# Altium footprint library MyLibrarySum.PcbLib: 208 footprints (part 5 of 13)
Each footprint in its own frame and in the unit in brackets; x right, y up, seen from the top. Pads: shape width x height; smd on the part's side, far side on the other; paste and mask are expansions set on the pad; w line width, h text height; cw(c..) or ccw(c..) is an arc to the next point about the centre after c.
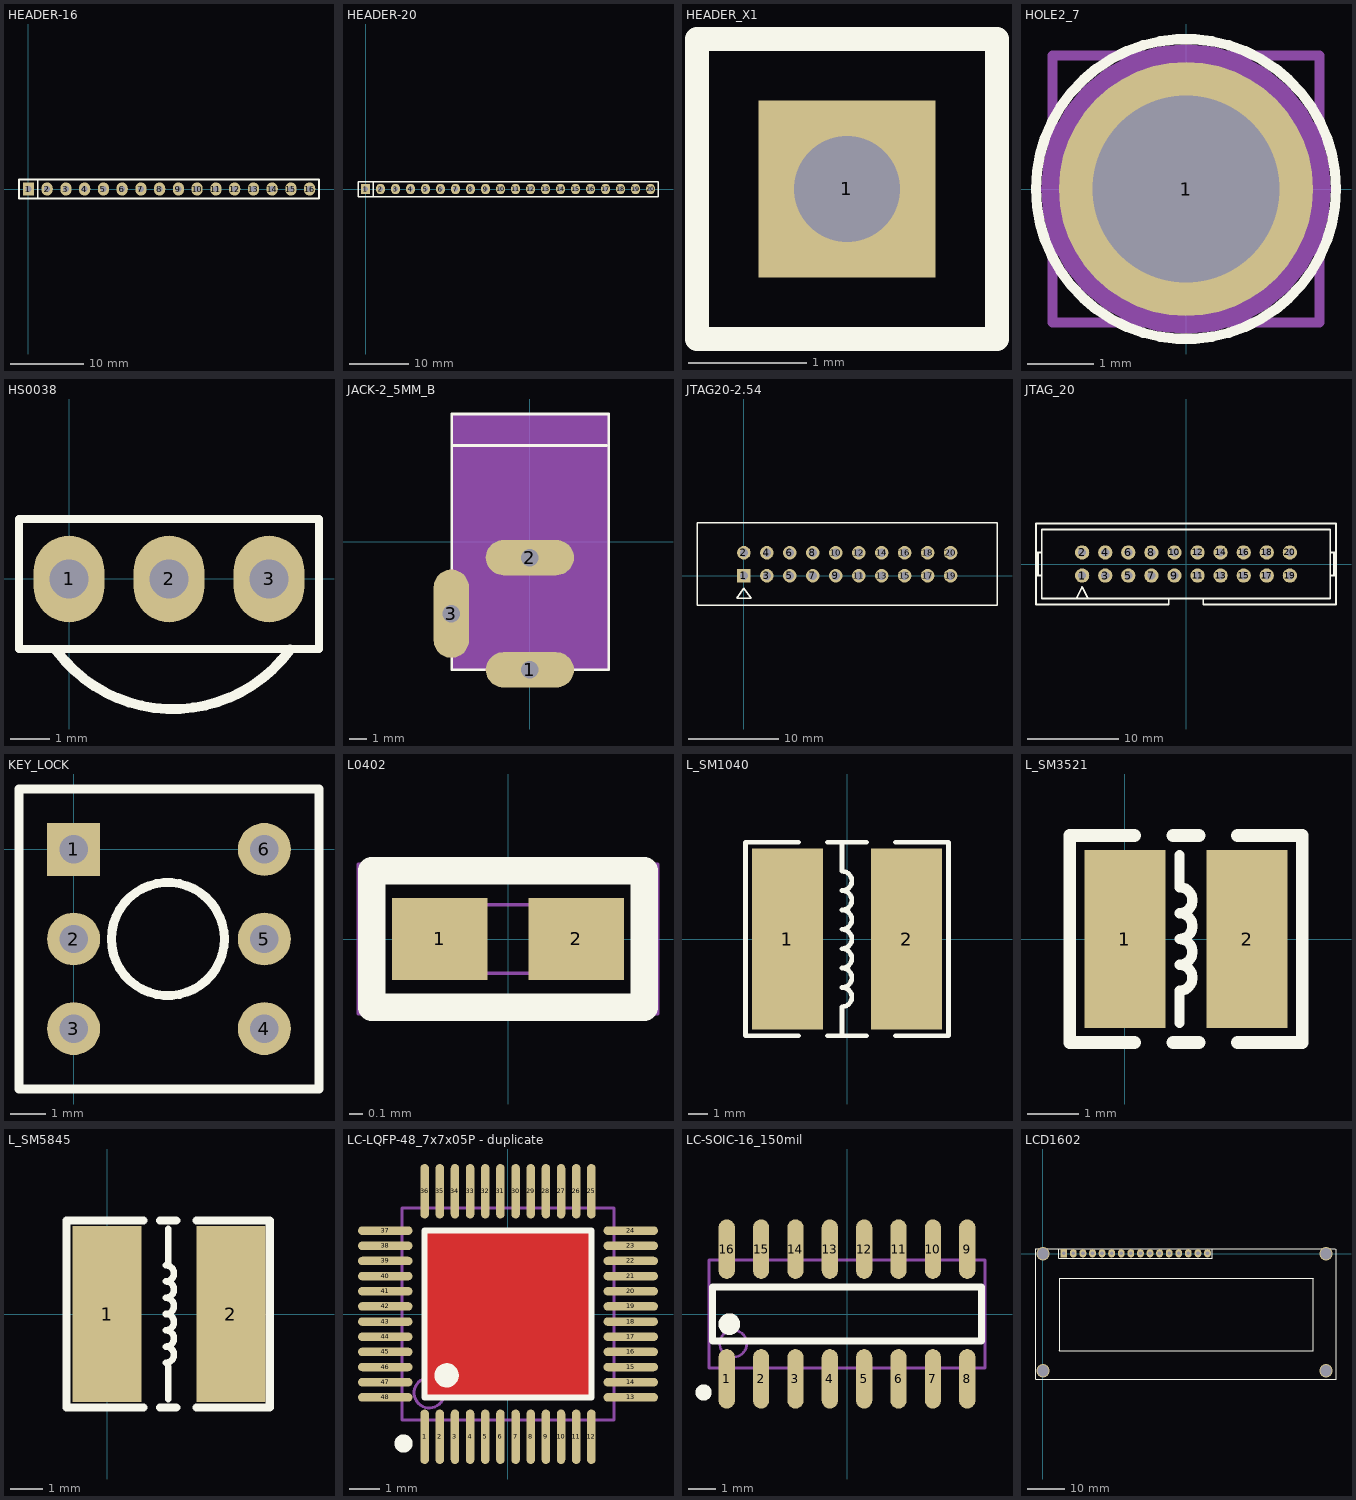
[diagram p4: the footprints below, top view; thin cyan lines are the x and y axes]

## HEADER-16 [mil]
pads (16):
  rect 60x70 hole 32: 1(0,0)
  oval 60x70 hole 32: 2(100,0) 3(200,0) 4(300,0) 5(400,0) 6(500,0) 7(600,0) 8(700,0) 9(800,0) 10(900,0) 11(1000,0) 12(1100,0) 13(1200,0) 14(1300,0) 15(1400,0) 16(1500,0)
Top Overlay:
  lines w10: 50,-50 50,50 ; -50,-50 -50,50 1550,50 1550,-50 -50,-50
3D body: height 397.64, standoff -59.06, extent -50,-50 1550,50

## HEADER-20 [mil]
pads (20):
  rect 60x70 hole 32: 1(0,0)
  oval 60x70 hole 32: 2(100,0) 3(200,0) 4(300,0) 5(400,0) 6(500,0) 7(600,0) 8(700,0) 9(800,0) 10(900,0) 11(1000,0) 12(1100,0) 13(1200,0) 14(1300,0) 15(1400,0) 16(1500,0) 17(1600,0) 18(1700,0) 19(1800,0) 20(1900,0)
Top Overlay:
  lines w10: 50,-50 50,50 ; -50,-50 1950,-50 1950,50 -50,50 -50,-50
3D body: height 397.64, standoff -59.06, extent -50,-40 1950,60

## HEADER_X1 [mm]
pads (1):
  rect 1.5x1.5 hole 0.9: 1(7.747,6.096)
Top Overlay:
  lines w0.2: 6.477,4.826 9.017,4.826 9.017,7.366 6.477,7.366 6.477,4.826

## HOLE2_7 [mil] "HOLE2_7"
pads (1):
  round 150 hole 110: 1(0,0)
Top Overlay:
  circle w5.98: c0,0 r88.46
Mechanical 11:
  text "1" at -8,0 h20
Mechanical 12:
  lines w5.98: -78.74,-78.74 78.74,-78.74 78.74,78.74 -78.74,78.74 -78.74,-78.74
Mechanical 13:
  pour cut-out: 85.41,0 83.77,16.66 78.91,32.69 71.02,47.45 60.39,60.39 47.45,71.02 32.69,78.91 16.66,83.77 0,85.41 -16.66,83.77 -32.69,78.91 -47.45,71.02 -60.39,60.39 -71.02,47.45 -78.91,32.69 -83.77,16.66 -85.41,0 -83.77,-16.66 -78.91,-32.69 -71.02,-47.45 -60.39,-60.39 -47.45,-71.02 -32.69,-78.91 -16.66,-83.77 0,-85.41 16.66,-83.77 32.69,-78.91 47.45,-71.02 60.39,-60.39 71.02,-47.45 78.91,-32.69 83.77,-16.66

## HS0038 [mm] "红外接收头"
pads (3):
  oval 1.8x2.2 hole 1: 1(0,0) 2(2.54,0) 3(5.08,0)
Top Overlay:
  lines w0.2: -1.27,-1.778 -1.27,1.524 6.35,1.524 6.35,-1.778 -1.27,-1.778
  lines w0.254: -0.315,-1.824 ccw(c2.639,0.381) 5.613,-1.797

## JACK-2_5MM_B [mm] "JACK-2_5MM_B"
pads (3):
  oval 5x2 hole 1: 1(0,-7.239) 2(0,-0.889)
  oval 2x5 hole 1: 3(-4.445,-4.064)
Top Overlay:
  lines w0.152: -4.318,5.461 4.318,5.461 ; -4.42,-7.239 4.47,-7.239 4.47,7.239 -4.42,7.239 -4.42,-7.239
Mechanical 11:
  text "2" at -0.254,-0.889 h0.64
  text "3" at -4.699,-4.064 h0.64
  text "1" at -0.254,-7.239 h0.64
Mechanical 13:
  region: -4.445,0.254 -4.445,-7.239 2.54,-7.239 4.445,-7.239 4.445,7.239 -4.445,7.239

## JTAG20-2.54 [mm]
pads (20):
  rect 1.5x1.5 hole 0.9: 1(0,0)
  round 1.5 hole 0.9: 2(0,2.54) 3(2.54,0) 4(2.54,2.54) 5(5.08,0) 6(5.08,2.54) 7(7.62,0) 8(7.62,2.54) 9(10.16,0) 10(10.16,2.54) 11(12.7,0) 12(12.7,2.54) 13(15.24,0) 14(15.24,2.54) 15(17.78,0) 16(17.78,2.54) 17(20.32,0) 18(20.32,2.54) 19(22.86,0) 20(22.86,2.54)
Top Overlay:
  lines w0.152: -5.182,-3.251 -5.182,5.842 27.991,5.842 27.991,-3.251 -5.182,-3.251 ; -0.8,-2.5 0.8,-2.5 0,-1.4 -0.8,-2.5
3D body: height 8.86, standoff -3, extent -5.197,-3.302 27.803,5.598

## JTAG_20 [mil]
pads (20):
  round 62 hole 35: 1(-450,-50) 2(-450,50) 3(-350,-50) 4(-350,50) 5(-250,-50) 6(-250,50) 7(-150,-50) 8(-150,50) 9(-50,-50) 10(-50,50) 11(50,-50) 12(50,50) 13(150,-50) 14(150,50) 15(250,-50) 16(250,50) 17(350,-50) 18(350,50) 19(450,-50) 20(450,50)
Top Overlay:
  lines w8: -650,-50 -625,-50 ; -650,50 -625,50 ; -641.67,-50 -641.67,50 ; -475,-150 -450,-100 -425,-150 ; -339.57,-175 -75,-175 -75,-150 ; -325,-175 -650,-175 -650,175 650,175 650,-175 325,-175 75,-175 75,-150 ; 625,-50 650,-50 ; 625,50 650,50 ; 641.67,-50 641.67,50 ; -75,-150 75,-150 ; -75,-150 -625,-150 -625,150 625,150 625,-150 75,-150
3D body: height 350, standoff -130, extent -575,-175 575,198

## KEY_LOCK [mm]
pads (6):
  rect 1.5x1.5 hole 0.8: 1(0,0)
  round 1.5 hole 0.8: 2(0,-2.54) 3(0,-5.08) 4(5.4,-5.08) 5(5.4,-2.54) 6(5.4,0)
Top Overlay:
  circle w0.254: c2.667,-2.54 r1.6
  lines w0.254: -1.55,-6.79 -1.55,1.71 6.95,1.71 6.95,-6.79 -1.55,-6.79
3D body: height 14, standoff -3.5, extent -1.905,-6.477 6.595,2.023

## L0402 [mm] "L0402"
pads (2):
  rect 0.7x0.6 smd: 1(-0.5,0) 2(0.5,0)
Top Overlay:
  lines w0.2: -1,-0.5 -1,0.5 1,0.5 1,-0.5 -1,-0.5
Mechanical 11:
  text "1" at -0.5,0 h0.6
  text "2" at 0.5,0 h0.6
Mechanical 13:
  lines w0.025: -1.1,-0.55 -1.1,0.55 1.1,0.55 1.1,-0.55 -1.1,-0.55
  text "1.1" at -1.1,-0.55 h0.6
Mechanical 16:
  lines w0.025: -0.5,-0.25 0.5,-0.25 0.5,0.25 -0.5,0.25 -0.5,-0.25
3D body: height 0.25, standoff -0.25, extent -0.5,-0.254 0.5,0.346

## L_SM1040 [mm] "10*9*4mm（长宽高）"
pads (2):
  rect 3.75x9.5 smd: 1(-3.125,0) 2(3.125,0)
Top Overlay:
  lines w0.254: -2.54,-5.08 -5.334,-5.08 -5.334,5.08 -2.54,5.08 ; -1.016,-5.08 1.016,-5.08 ; -1.016,5.08 1.016,5.08 ; -0.254,-5.08 -0.254,-3.556 ccw(c-0.254,-3.048) -0.254,-2.54 ccw(c-0.254,-2.032) -0.254,-1.524 ccw(c-0.254,-1.016) -0.254,-0.508 ccw(c-0.254,0) -0.254,0.508 ccw(c-0.254,1.016) -0.254,1.524 ccw(c-0.254,2.032) -0.254,2.54 ccw(c-0.254,3.048) -0.254,3.556 -0.254,5.08 ; 2.54,-5.08 5.334,-5.08 5.334,5.08 2.54,5.08
3D body: height 4.7, standoff 0, extent -4.954,-4.5 4.954,4.5

## L_SM3521 [mm] "3.5x3.0x2.1"
pads (2):
  rect 1.6x3.5 smd: 1(0,0) 2(2.4,0)
Top Overlay:
  lines w0.203: 1.073,-1.651 1.073,-1.016 ccw(c1.073,-0.762) 1.073,-0.508 ccw(c1.073,-0.254) 1.073,0 ccw(c1.073,0.254) 1.073,0.508 ccw(c1.073,0.762) 1.073,1.016 1.073,1.651
  lines w0.254: 0.184,-2.032 -1.086,-2.032 -1.086,2.032 0.184,2.032 ; 0.946,-2.032 1.454,-2.032 ; 0.946,2.032 1.454,2.032 ; 2.216,-2.032 3.486,-2.032 3.486,2.032 2.216,2.032
3D body: height 2.15, standoff 0.05, extent -0.507,-1.5 2.907,1.5

## L_SM5845 [mm] "5.8x5.2x4.5mm"
pads (2):
  rect 2.15x5.5 smd: 1(0,0) 2(3.867,0)
Top Overlay:
  lines w0.203: 1.835,-1.524 ccw(c1.835,-1.27) 1.835,-1.016 ccw(c1.835,-0.762) 1.835,-0.508 ccw(c1.835,-0.254) 1.835,0 ccw(c1.835,0.254) 1.835,0.508 ccw(c1.835,0.762) 1.835,1.016 ccw(c1.835,1.27) 1.835,1.524 ; 1.905,-2.667 1.905,-1.651 ; 1.905,1.524 1.905,2.667
  lines w0.254: 1.143,-2.921 -1.27,-2.921 -1.27,2.921 1.143,2.921 ; 1.651,-2.921 2.159,-2.921 ; 1.651,2.921 2.159,2.921 ; 2.794,-2.921 5.08,-2.921 5.08,2.921 2.794,2.921
3D body: height 2.15, standoff 0.05, extent -0.507,-1.5 2.907,1.5

## LC-LQFP-48_7x7x05P - duplicate [mm]
pads (48):
  oval 0.28x1.8 smd mask+0.051: 1(-2.75,-4.05) 2(-2.25,-4.05) 3(-1.75,-4.05) 4(-1.25,-4.05) 5(-0.75,-4.05) 6(-0.25,-4.05) 7(0.25,-4.05) 8(0.75,-4.05) 9(1.25,-4.05) 10(1.75,-4.05) 11(2.25,-4.05) 12(2.75,-4.05) 25(2.75,4.05) 26(2.25,4.05) 27(1.75,4.05) 28(1.25,4.05) 29(0.75,4.05) 30(0.25,4.05) 31(-0.25,4.05) 32(-0.75,4.05) 33(-1.25,4.05) 34(-1.75,4.05) 35(-2.25,4.05) 36(-2.75,4.05)
  oval 1.8x0.28 smd mask+0.051: 13(4.05,-2.75) 14(4.05,-2.25) 15(4.05,-1.75) 16(4.05,-1.25) 17(4.05,-0.75) 18(4.05,-0.25) 19(4.05,0.25) 20(4.05,0.75) 21(4.05,1.25) 22(4.05,1.75) 23(4.05,2.25) 24(4.05,2.75) 37(-4.05,2.75) 38(-4.05,2.25) 39(-4.05,1.75) 40(-4.05,1.25) 41(-4.05,0.75) 42(-4.05,0.25) 43(-4.05,-0.25) 44(-4.05,-0.75) 45(-4.05,-1.25) 46(-4.05,-1.75) 47(-4.05,-2.25) 48(-4.05,-2.75)
Top Layer:
  rectangle: -2.667,-2.667 2.667,2.667
Top Overlay:
  circle w0.4: c-2.025,-2.025 r0.2
  circle w0.3: c-3.45,-4.275 r0.15
  lines w0.2: -2.75,-2.75 -2.75,2.75 2.75,2.75 2.75,-2.75 -2.75,-2.75
Mechanical 13:
  circle w0.1: c-2.6,-2.6 r0.5
  lines w0.1: -3.5,-3.5 -3.5,3.5 3.5,3.5 3.5,-3.5 -3.5,-3.5

## LC-SOIC-16_150mil [mm]
pads (16):
  oval 0.6x2.2 smd: 1(-4.445,-2.4) 2(-3.175,-2.4) 3(-1.905,-2.4) 4(-0.635,-2.4) 5(0.635,-2.4) 6(1.905,-2.4) 7(3.175,-2.4) 8(4.445,-2.4) 9(4.445,2.4) 10(3.175,2.4) 11(1.905,2.4) 12(0.635,2.4) 13(-0.635,2.4) 14(-1.905,2.4) 15(-3.175,2.4) 16(-4.445,2.4)
Top Overlay:
  circle w0.4: c-4.35,-0.375 r0.2
  circle w0.3: c-5.3,-2.9 r0.15
  lines w0.254: -4.975,-1 -4.975,1 4.975,1 4.975,-1 -4.975,-1
Mechanical 13:
  circle w0.1: c-4.205,-1.095 r0.5
  lines w0.1: -5.105,-1.995 -5.105,1.995 5.105,1.995 5.105,-1.995 -5.105,-1.995
3D body: height 1.95, standoff 0, extent -5.15,-3.135 5.15,2.921

## LCD1602 [mm]
pads (16):
  rect 1.8x2.2 hole 1: 1(5.5,0.1)
  oval 1.8x2.2 hole 1: 2(8.04,0.1) 3(10.58,0.1) 4(13.12,0.1) 5(15.66,0.1) 6(18.2,0.1) 7(20.74,0.1) 8(23.28,0.1) 9(25.82,0.1) 10(28.36,0.1) 11(30.9,0.1) 12(33.44,0.1) 13(35.98,0.1) 14(38.52,0.1) 15(41.06,0.1) 16(43.6,0.1)
via 0,0 diameter 3.5 hole 3
via 75,0 diameter 3.5 hole 3
via 0,-31 diameter 3.5 hole 3
via 75,-31 diameter 3.5 hole 3
Top Overlay:
  lines w0.2: 5.207,1.37 -1.841,1.37 -1.841,-33.326 77.636,-33.326 77.636,1.116 77.382,1.37 44.87,1.37 ; 44.87,1.37 44.87,-1.17 4.23,-1.17 4.23,1.37 6.135,1.37 44.87,1.37 ; 4.267,-25.654 4.394,-25.527 4.394,-6.452 71.425,-6.452 71.552,-6.579 71.552,-25.679 71.526,-25.654 4.267,-25.654